# Altium footprint library PCB_Lib_Devzone.PcbLib: 491 footprints (part 2 of 31)
Each footprint in its own frame and in the unit in brackets; x right, y up, seen from the top. Pads: shape width x height; smd on the part's side, far side on the other; paste and mask are expansions set on the pad; w line width, h text height; cw(c..) or ccw(c..) is an arc to the next point about the centre after c.
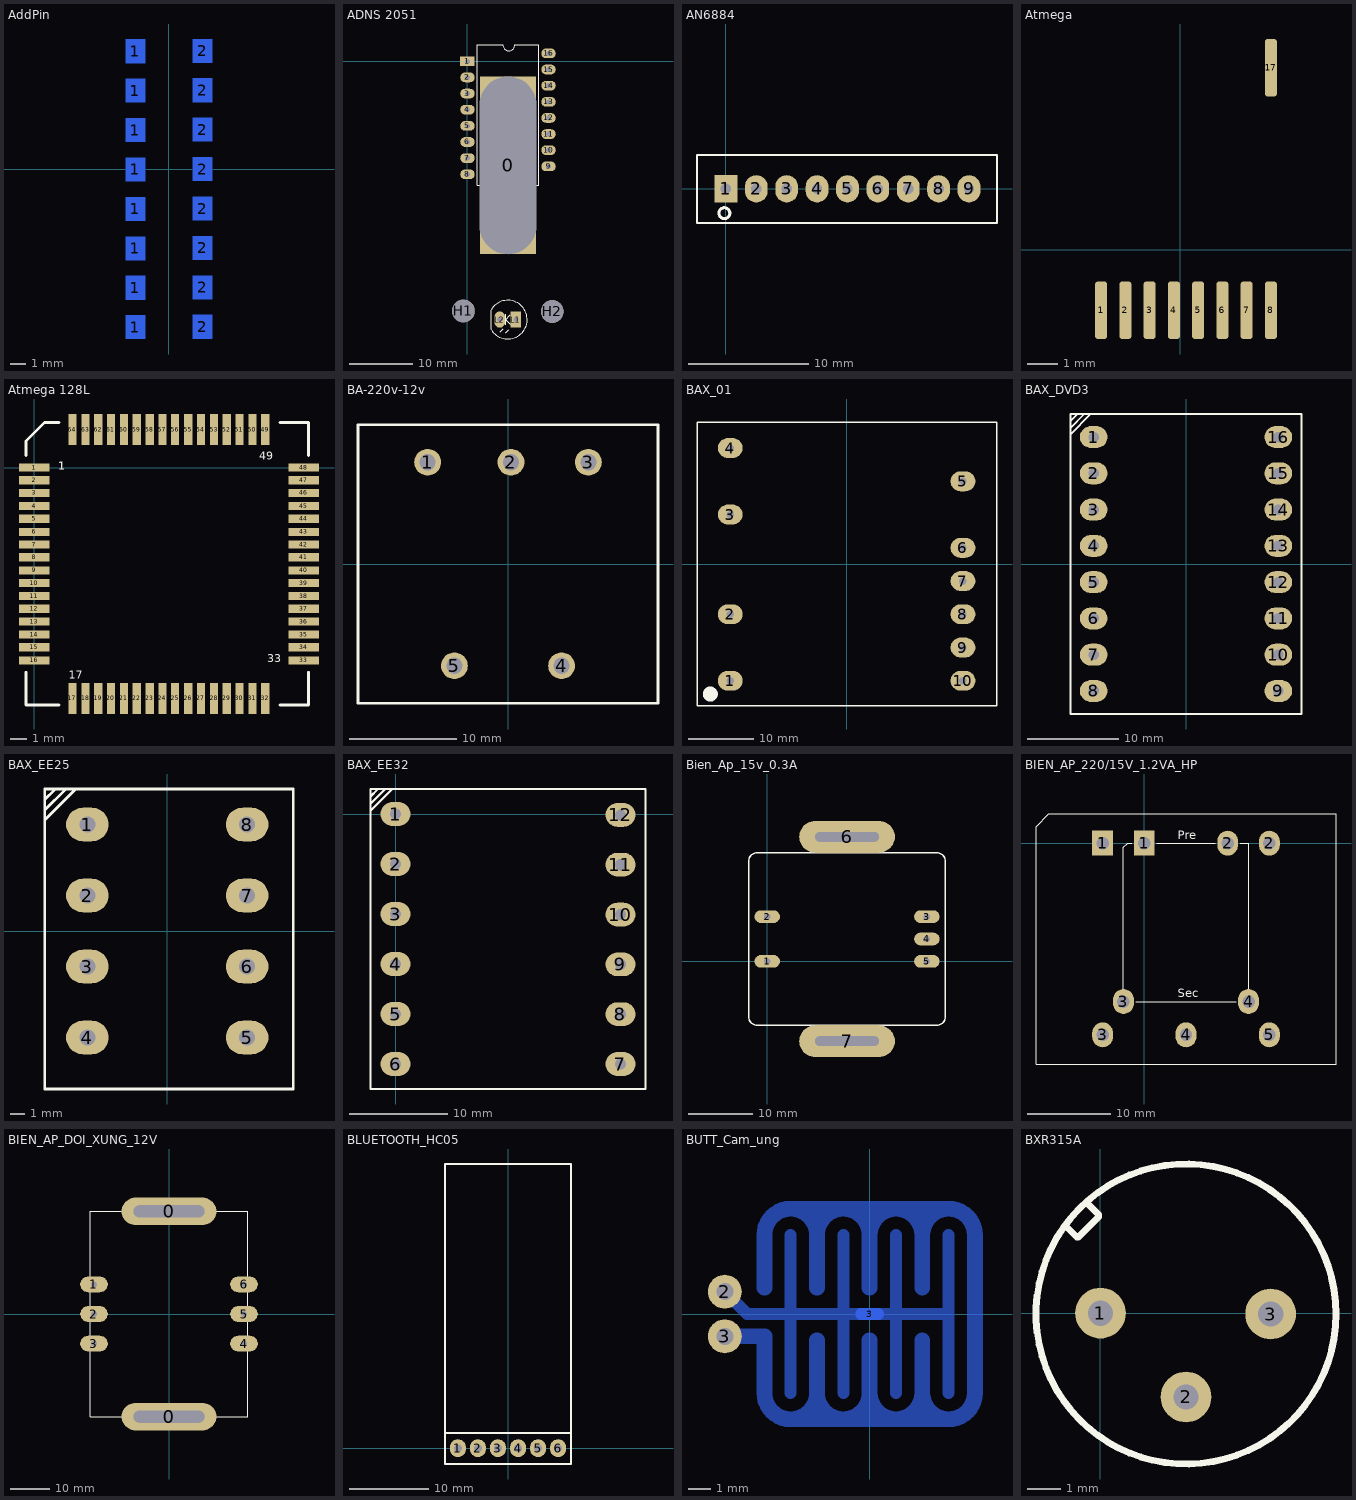
[diagram p1: the footprints below, top view; thin cyan lines are the x and y axes]

## AddPin [mil] "Add"
pads (16):
  rect 50x60 smd far side: 1(-84,-400) 1(-84,-300) 1(-84,-200) 1(-84,-100) 1(-84,0) 1(-84,100) 1(-84,200) 1(-84,300) 2(86,-399) 2(86,-299) 2(86,-199) 2(86,-99) 2(86,1) 2(86,101) 2(86,201) 2(86,301)

## ADNS 2051 [mil] "Foots pin for Mouse"
pads (21):
  rect 350x1100 hole 350 slot 1100 at 90 deg: 0(251,-645)
  rect 90x60 hole 31: 1(0,0)
  oval 90x60 hole 31: 2(0,-100) 3(0,-200) 4(0,-300) 5(0,-400) 6(0,-500) 7(0,-600) 8(0,-700) 9(502,-651) 10(502,-551) 11(502,-451) 12(502,-351) 13(502,-251) 14(502,-151) 15(502,-51) 16(502,49)
  round 140 hole 140: H1(-25,-1547) H2(525,-1550)
  rect 65x100 hole 32: L1(300,-1600.5)
  oval 65x100 hole 32: L2(200,-1600.5)
Top Overlay:
  lines w7: 146,-1660.5 146,-1541.5 ; 146.06,-1540.53 cw(c250,-1600.5) 146.49,-1661.21 ; 204,-1675.5 221,-1658.5 ; 218,103 59,103 59,-767 443,-767 443,103 296,103 ; 218.97,101 ccw(c255.99,101) 293,101 ; 236,-1632.5 236,-1566.5 ; 238,-1681.5 255,-1664.5 ; 265,-1629.5 236,-1600.5 265,-1571.5 ; 394.94,-516.95 ccw(c252.8,-525.96) 395,-518
  text "ADNS2051" at 108,-229 h40

## AN6884 [mil]
pads (9):
  rect 75x90 hole 34: 1(0,0)
  oval 75x90 hole 34: 2(100,0) 3(200,0) 4(300,0) 5(400,0) 6(500,0) 7(600,0) 8(700,0) 9(800,0)
Top Overlay:
  circle w10: c-5,-80 r18
  lines w7: -95,-112 -95,111 -32,111 892,111 892,-112 -95,-112

## Atmega [mm]
pads (9):
  rrect50% 0.4x1.9 smd: 1(-2.606,-1.992) 2(-1.806,-1.992) 3(-1.006,-1.992) 4(-0.206,-1.992) 5(0.594,-1.992) 6(1.394,-1.992) 7(2.194,-1.992) 8(2.994,-1.992) 17(2.994,6.008)

## Atmega 128L [mil] "Atmega 128L, 64 pin SMT"
height 100
pads (64):
  rect 75x20 smd: 1(0,0) 2(0,-31) 3(0,-62) 4(0,-94) 5(0,-125) 6(0,-157) 7(0,-188) 8(0,-219) 9(0,-251) 10(0,-282) 11(0,-314) 12(0,-345) 13(0,-376) 14(0,-408) 15(0,-439) 16(0,-471) 33(658,-471) 34(658,-439) 35(658,-408) 36(658,-376) 37(658,-345) 38(658,-314) 39(658,-282) 40(658,-251) 41(658,-219) 42(658,-188) 43(658,-157) 44(658,-125) 45(658,-94) 46(658,-62) 47(658,-31) 48(658,0)
  rect 20x75 smd: 17(93,-564) 18(125,-564) 19(156,-564) 20(187,-564) 21(219,-564) 22(250,-564) 23(282,-564) 24(313,-564) 25(344,-564) 26(376,-564) 27(407,-564) 28(439,-564) 29(470,-564) 30(501,-564) 31(533,-564) 32(564,-564) 49(564,93) 50(533,93) 51(501,93) 52(470,93) 53(439,93) 54(407,93) 55(376,93) 56(344,93) 57(313,93) 58(282,93) 59(250,93) 60(219,93) 61(187,93) 62(156,93) 63(125,93) 64(93,93)
Top Overlay:
  lines w7: -20,-500 -20,-580 60,-580 ; -20,30 -20,65 25,110 60,110 ; 600,-580 670,-580 670,-500 ; 600,110 670,110 670,30
  text "1" at 59,-5.5 h20
  text "1" at 59,-5.5 h20
  text "49" at 549,19.5 h20
  text "17" at 84,-515.5 h20
  text "33" at 569,-475.5 h20

## BA-220v-12v [mm]
pads (5):
  round 2.5 hole 1.5: 1(-7.5,9.5) 2(0.279,9.5) 3(7.5,9.5) 4(5,-9.5) 5(-5,-9.5)
Top Overlay:
  lines w0.254: -14,-13 -14,13 14,13 14,-13 -14,-13

## BAX_01 [mil] "Bien ap xung cho nguon T9AT"
pads (10):
  oval 150x120 hole 45: 1(-700,-700) 2(-700,-300) 3(-700,300) 4(-700,700) 5(700,500) 6(700,100) 7(700,-100) 8(700,-300) 9(700,-500) 10(700,-700)
Top Overlay:
  circle w50: c-820,-780 r20
  lines w8: -900,-850 -900,855 905,855 905,-850 -900,-850

## BAX_DVD3 [mil] "Bien ap xung DVD3"
pads (16):
  oval 120x95 hole 45: 1(-400,550) 2(-400,392.86) 3(-400,235.71) 4(-400,78.57) 5(-400,-78.57) 6(-400,-235.71) 7(-400,-392.86) 8(-400,-550) 9(400,-550) 10(400,-392.86) 11(400,-235.71) 12(400,-78.57) 13(400,78.57) 14(400,235.71) 15(400,392.86) 16(400,550)
Top Overlay:
  lines w8: -500,563 -414,649 ; -500,589 -500,591 -442,649 ; -500,618 -500,620 -471,649 ; -500,-650 -500,650 490,650 500,650 500,-650 -500,-650

## BAX_EE25 [mil] "EE25"
pads (8):
  oval 120x95 hole 45: 1(-225,300) 2(-225,100) 3(-225,-100) 4(-225,-300) 5(225,-300) 6(225,-100) 7(225,100) 8(225,300)
Top Overlay:
  lines w8: -345,313 -259,399 ; -345,339 -345,341 -287,399 ; -345,368 -345,370 -316,399 ; -345,-445 -345,400 355,400 355,-445 -345,-445

## BAX_EE32 [mil] "EE32"
pads (12):
  oval 120x95 hole 45: 1(0,0) 2(0,-200) 3(0,-400) 4(0,-600) 5(0,-800) 6(0,-1000) 7(900,-1000) 8(900,-800.71) 9(900,-601.43) 10(900,-402.14) 11(900,-202.86) 12(900,-3.57)
Top Overlay:
  lines w8: -100,13 -14,99 ; -100,39 -100,41 -42,99 ; -100,68 -100,70 -71,99 ; -100,-1100 -100,100 1000,100 1000,-1100 -100,-1100

## Bien_Ap_15v_0.3A [mm]
pads (7):
  oval 4x2 hole 1: 1(0,0) 2(0,7) 3(25,7) 4(25,3.5) 5(25,0)
  oval 15x5 hole 1.5 slot 10 at 0 deg: 6(12.5,19.5) 7(12.5,-12.5)
Top Overlay:
  lines w0.254: -2.896,-8.73 ccw(c-1.626,-8.73) -1.626,-10 24.58,-10 26.619,-10 ccw(c26.619,-8.73) 27.889,-8.73 27.889,-5.253 27.889,13.148 27.889,15.73 ccw(c26.619,15.73) 26.619,17 24.072,17 -1.041,17 -1.626,17 ccw(c-1.626,15.73) -2.896,15.73 -2.896,14.072 -2.896,-6.02 -2.896,-8.73

## BIEN_AP_220/15V_1.2VA_HP [mm]
pads (9):
  rect 2.5x3 hole 1.5: 1(-5,0) 1(0,0)
  oval 2.5x3 hole 1.5: 2(10,0) 2(15,0) 3(-5,-23) 3(-2.5,-19) 4(5,-23) 4(12.5,-19) 5(15,-23)
Top Overlay:
  lines w0.05: -2.5,-17.5 -2.5,-0.5 -2,0 -1.5,0 ; -1,-19 11,-19 ; 1.5,0 8.5,0 ; 11.5,0 12.5,0 12.5,-17.5
  lines w0.1: -13,-26.5 -13,2 -11.5,3.5 23,3.5 23,-26.5 -13,-26.5
  text "Sec" at 4,-18.5 h1
  text "Pre" at 4,0.5 h1
3D body "18074N''.stp": height 29, standoff -5.3, extent -10.435,-25.766 21.865,1.534

## BIEN_AP_DOI_XUNG_12V [mm]
pads (8):
  oval 24x7 hole 3 slot 18 at 0 deg: 0(0,-26) 0(0,26)
  oval 7x4 hole 1.5: 1(-19,7.5) 2(-19,0) 3(-19,-7.5) 4(19,-7.5) 5(19,0) 6(19,7.5)
Top Overlay:
  lines w0.254: -20,26 -20,-26 20,-26 20,26 -19.933,26

## BLUETOOTH_HC05 [mil]
pads (6):
  oval 80x90 hole 39.37: 1(-250,0) 2(-150,0) 3(-50,0) 4(50,0) 5(150,0) 6(250,0)
Top Overlay:
  lines w10: -315,76 314.96,76 ; -314.96,-78.74 -314.96,1417.32 315,1417.32 314.96,-78.74 -314.96,-78.74

## BUTT_Cam_ung [mil]
pads (3):
  round 60 hole 30: 2(-255.91,39.37) 3(-255.91,-39.37)
  oval 50x21 smd far side mask+0: 3(0,0)
Bottom Layer:
  lines w18: 18.5,-188.86 cw(c22.55,-188.86) 19.68,-186
  lines w21: -255.91,39.37 -216.54,0 -186,0 ; -203.5,0 -186,0 ; -139.5,-139.5 -139.5,139.5 ; -46.5,-139.5 -46.5,139.5 ; 46.5,-139.5 46.5,139.5 ; 139.5,-139.5 139.5,139.5 ; 139.5,0 -186,0
  lines w28: -255.91,-39.37 -186,-39.37 -186,-53 ; -186,-46.5 -186,-139.5 ccw(c-139.5,-139.5) -93,-139.5 ccw(c-46.5,-139.5) 0,-139.5 ccw(c46.5,-139.5) 93,-139.5 ccw(c139.5,-139.5) 186,-139.5 186,139.5 ccw(c139.5,139.5) 93,139.5 ccw(c46.5,139.5) 0,139.5 ccw(c-46.5,139.5) -93,139.5 ccw(c-139.5,139.5) -186,139.5 -186,46.5 ; -139.5,-186 139.5,-186 ; -139.5,186 139.5,186 ; -93,-186 -93,-46.5 ; -93,46.5 -93,186 ; 0,-186 0,-46.5 ; 0,46.5 0,186 ; 93,-186 93,-46.5 ; 93,46.5 93,186
Bottom Overlay:
  lines w8: -305,-225 225,-225 225,225 -305,225 -305,-225

## BXR315A [mil] "Xtal for RF"
pads (3):
  round 60 hole 30: 1(0,0) 2(101,-99) 3(201,-1)
Top Overlay:
  circle w8: c101,-1 r177.17
  lines w8: -41,103 -28,90 -26,90 -2,114 -2,116 -15,129